# Altium footprint library GyokuRe.PcbLib: 1248 footprints (part 21 of 78)
Each footprint in its own frame and in the unit in brackets; x right, y up, seen from the top. Pads: shape width x height; smd on the part's side, far side on the other; paste and mask are expansions set on the pad; w line width, h text height; cw(c..) or ccw(c..) is an arc to the next point about the centre after c.
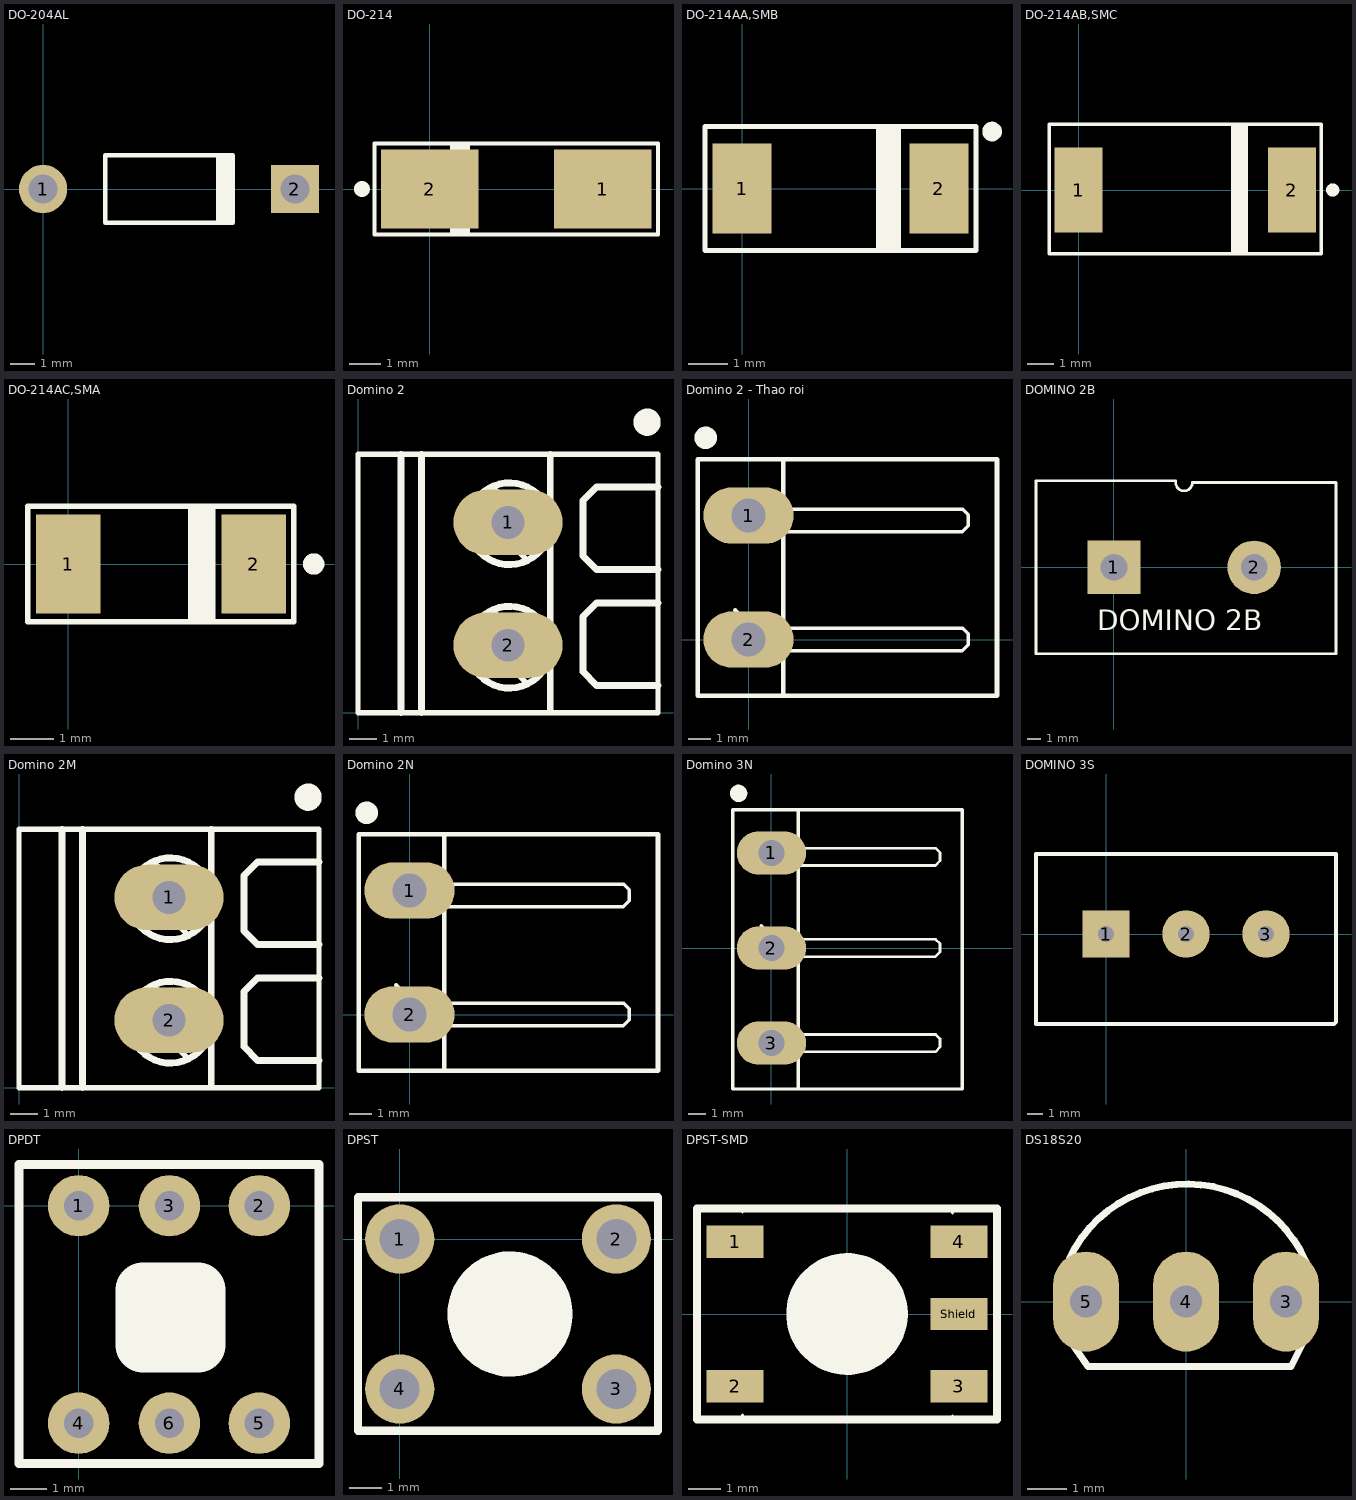
[diagram p20: the footprints below, top view; thin cyan lines are the x and y axes]

## DO-204AL [mm] "Diode, Axial; Body 5.2 x 2.7 mm (LxDia. max), Lead Dia. 0.86 mm (max)"
height 2.7
pads (2):
  round 2 hole 1.2: 1(0,0)
  rect 2x2 hole 1.2: 2(10.46,0)
Top Overlay:
  rectangle: 7.18,-1.4 7.98,1.4
  lines w0.2: 7.88,-1.4 2.58,-1.4 2.58,1.4 7.88,1.4

## DO-214 [mm]
pads (2):
  rect 3.1x2.5 smd: 1(5.5,0) 2(0,0)
Top Overlay:
  circle w0.25: c-2.157,0 r0.125
  rectangle: 0.635,-1.45 1.27,1.45
  lines w0.127: -1.75,-1.45 7.25,-1.45 7.25,1.45 -1.75,1.45 -1.75,-1.45

## DO-214AA,SMB [mm]
pads (2):
  rect 1.5x2.3 smd: 1(0,0) 2(5,0)
Top Overlay:
  circle w0.25: c6.352,1.448 r0.125
  rectangle: 3.404,-1.6 4.039,1.575
  lines w0.127: -0.95,-1.575 5.944,-1.575 5.944,1.575 -0.95,1.575 -0.95,-1.575
3D body "DO-214AA SMB.STEP": height 2.3, standoff 0, extent -0.185,-1.778 5.215,1.822

## DO-214AB,SMC [mm]
height 0.508
pads (2):
  rect 1.8x3.2 smd: 1(0,0) 2(8,0)
Top Overlay:
  circle w0.25: c9.527,0 r0.125
  rectangle: 5.715,-2.388 6.35,2.464
  lines w0.127: -1.1,-2.388 9.1,-2.388 9.1,2.464 -1.1,2.464 -1.1,-2.388
3D body "DO-214AB SMC.STEP": height 2.3, standoff 0, extent 0.038,-2.972 7.988,2.928

## DO-214AC,SMA [mil]
pads (2):
  rect 59.06x90.55 smd: 1(0,0) 2(170,0)
Top Overlay:
  circle w9.84: c225.08,0 r4.92
  rectangle: 110,-53.15 135,53.15
  lines w5: -37.4,-53.15 206.69,-53.15 206.69,53.15 -37.4,53.15 -37.4,-53.15
3D body "DO-214AC SMA.STEP": height 94.69, standoff 0, extent -17.36,-51 187.36,51.36

## Domino 2 [mm]
pads (2):
  oval 4x2.4 hole 1.2: 1(5.5,6.975) 2(5.5,2.475)
Top Overlay:
  circle w0.5: c10.6,10.65 r0.25
  circle w0.254: c5.55,2.4 r1.5
  circle w0.254: c5.55,6.925 r1.5
  lines w0.2: 4.2,3.075 6.2,1.075 ; 4.2,7.6 6.2,5.6 ; 4.912,3.762 6.913,1.762 ; 4.912,8.287 6.913,6.287 ; 0,0 0,9.475 11,9.475 11,0 0,0
  lines w0.254: 1.575,0 1.575,9.475 ; 2.325,0 2.325,9.475 ; 7.05,0.025 7.05,9.475 ; 11,1 8.75,1 8.25,1.5 8.25,3.525 8.75,4.025 11,4.025 ; 11,5.25 8.75,5.25 8.25,5.75 8.25,7.775 8.75,8.275 11,8.275
3D body: height 4.5, standoff 0.01, extent 0,0 11,9.475
3D body: height 8.5, standoff 4.5, extent 2.8,0.975 7.5,8.475
3D body: height 2.5, standoff -1, extent 4.975,6.425 6.075,7.525
3D body: height 2.5, standoff -1, extent 4.975,1.9 6.075,3
3D body: height 3.5, standoff 1, extent 9.266,6.191 10.25,7.701
3D body: height 3.5, standoff 1, extent 9.266,1.841 10.25,3.351
3D body: height 8.55, standoff 7.6, extent 4.4,5.95 6.65,8
3D body: height 8.6, standoff 7.6, extent 4.504,6.05 5.404,7.9
3D body: height 8.6, standoff 7.6, extent 5.654,6.058 6.554,7.908
3D body: height 8.6, standoff 7.6, extent 5.654,1.533 6.554,3.383
3D body: height 8.6, standoff 7.6, extent 4.504,1.525 5.404,3.375
3D body: height 8.55, standoff 7.6, extent 4.4,1.425 6.65,3.475

## Domino 2 - Thao roi [mm]
pads (2):
  oval 4x2.5 hole 1.5: 1(0,5.5) 2(0,0)
Top Overlay:
  circle w0.5: c-1.9,8.95 r0.25
  lines w0.15: 1.55,-0.6 1.65,-0.5 9.475,-0.5 9.75,-0.225 9.75,0.25 9.5,0.5 1.55,0.5 ; 1.55,4.675 1.65,4.775 9.475,4.775 9.75,5.05 9.75,5.525 9.5,5.775 1.55,5.775
  lines w0.2: -0.587,1.287 1.413,-0.713 ; 1.55,-2.5 1.55,7.925 ; -2.25,-2.5 -2.25,8 11.025,8 11.025,-2.5 -2.25,-2.5
Bottom Overlay:
  lines w0.1: -2.286,-2.489 -2.286,7.976 11.024,7.976 11.024,-2.489 -2.286,-2.489
3D body: height 9, standoff 7.9, extent 8.458,-2.489 11.074,8.001
3D body: height 5.5, standoff 4.5, extent 0,5.001 10,5.999
3D body: height 5.5, standoff 4.5, extent 0,-0.499 10,0.499
3D body: height 8, standoff 1, extent -1.092,-2.54 0.254,7.925
3D body: height 1, standoff 0.1, extent -1.092,-2.489 11.074,7.976
3D body: height 8, standoff 7, extent -1.092,-2.489 11.074,7.976

## DOMINO 2B [mm]
pads (2):
  rect 4x4 hole 2: 1(0,0)
  round 4 hole 2: 2(10.5,0)
Top Overlay:
  lines w0.2: 4.625,6.35 ccw(c5.25,6.35) 5.875,6.35 16.637,6.35 16.637,-6.477 -5.842,-6.477 -5.842,6.477 4.625,6.477
  text "DOMINO 2B" at -1.27,-4.699 h1.52

## Domino 2M [mm]
pads (2):
  oval 4x2.4 hole 1.2: 1(5.5,6.975) 2(5.5,2.475)
Top Overlay:
  circle w0.254: c5.55,6.925 r1.5
  circle w0.254: c5.55,2.4 r1.5
  circle w0.5: c10.6,10.65 r0.25
  lines w0.2: 4.2,3.075 6.2,1.075 ; 4.2,7.6 6.2,5.6 ; 4.912,3.762 6.913,1.762 ; 4.912,8.287 6.913,6.287 ; 0,0 11,0 11,9.475 0,9.475 0,0
  lines w0.254: 1.575,0 1.575,9.475 ; 2.325,0 2.325,9.475 ; 7.05,0.025 7.05,9.475 ; 11,1 8.75,1 8.25,1.5 8.25,3.525 8.75,4.025 11,4.025 ; 11,5.25 8.75,5.25 8.25,5.75 8.25,7.775 8.75,8.275 11,8.275
3D body "KRM2 domino 2 nho.STEP": height 10, standoff -4, extent 1.346,-0.225 8.846,9.775
3D body: height 8.6, standoff 7.6, extent 4.504,1.525 5.404,3.375
3D body: height 8.6, standoff 7.6, extent 5.654,1.533 6.554,3.383
3D body: height 8.6, standoff 7.6, extent 5.654,6.058 6.554,7.908
3D body: height 8.6, standoff 7.6, extent 4.504,6.05 5.404,7.9

## Domino 2N [mm]
pads (2):
  oval 4x2.5 hole 1.5: 1(0,5.5) 2(0,0)
Top Overlay:
  circle w0.5: c-1.9,8.95 r0.25
  lines w0.15: 1.55,-0.6 1.65,-0.5 9.475,-0.5 9.75,-0.225 9.75,0.25 9.5,0.5 1.55,0.5 ; 1.55,4.675 1.65,4.775 9.475,4.775 9.75,5.05 9.75,5.525 9.5,5.775 1.55,5.775
  lines w0.2: -0.587,1.287 1.413,-0.713 ; 1.55,-2.5 1.55,7.925 ; -2.25,-2.5 -2.25,8 11.025,8 11.025,-2.5 -2.25,-2.5
Bottom Overlay:
  lines w0.1: -2.286,-2.489 -2.286,7.976 11.024,7.976 11.024,-2.489 -2.286,-2.489
3D body "Domino2N.STEP": height 8.47, standoff -4, extent -1.758,-2.21 10.242,7.79

## Domino 3N [mm]
pads (3):
  oval 4x2.5 hole 1.5: 1(0,5.5) 2(0,0) 3(0,-5.5)
Top Overlay:
  circle w0.5: c-1.9,8.95 r0.25
  lines w0.15: 1.55,-6.1 1.65,-6 9.475,-6 9.75,-5.725 9.75,-5.25 9.5,-5 1.55,-5 ; 1.55,-0.6 1.65,-0.5 9.475,-0.5 9.75,-0.225 9.75,0.25 9.5,0.5 1.55,0.5 ; 1.55,4.675 1.65,4.775 9.475,4.775 9.75,5.05 9.75,5.525 9.5,5.775 1.55,5.775
  lines w0.2: -0.587,1.287 1.413,-0.713 ; 1.55,-8.153 1.55,7.925 ; -2.25,-8.153 11.025,-8.153 11.025,8 -2.25,8 -2.25,-8.153
Bottom Overlay:
  lines w0.1: -2.286,-8.153 11.024,-8.153 11.024,7.976 -2.286,7.976 -2.286,-8.153

## DOMINO 3S [mm] "3 terminal 5.04 spacing"
pads (3):
  rect 3x3 hole 1: 1(0,0)
  round 3 hole 1: 2(5.08,0) 3(10.16,0)
Top Overlay:
  lines w0.254: -4.445,-5.715 14.478,-5.715 14.605,-5.588 14.605,5.08 -4.445,5.08 -4.445,-5.715

## DPDT [mil] "Double-Pole, Double-Throw Switch; 6 Leads; Solder Pad 35mil"
pads (6):
  round 67 hole 32: 1(0,0) 2(197,0) 3(99,0) 4(0,-237) 5(197,-237) 6(99,-237)
Top Overlay:
  lines w10: -65,-281 -65,45 262,45 262,-281 -65,-281
  lines w60: 70,-152 70,-92 130,-92 130,-152 70,-152
3D body "User Library-PSM1-0-0.STEP": height 531.5, standoff -137.8, extent -58.96,-275.48 256,39.48

## DPST [mil] "Double-Pole, Single-Throw Switch; 4 Leads; Solder Pad 35mil"
pads (4):
  round 83 hole 48: 1(0,0) 2(260,0) 3(260,-180) 4(0,-180)
Top Overlay:
  circle w80: c132.5,-90 r35
  lines w10: -50,-230 310,-230 310,50 -50,50 -50,-230
3D body "SW3dPS-diptronics tactile dts-63k.STEP": height 275.59, standoff -137.8, extent -25.51,-212.04 285.52,32.06

## DPST-SMD [mil] "Double-Pole, Single-Throw Switch; 4 Leads; Solder Pad 35mil"
pads (5):
  rect 70x40 smd: 1(-138,89) 2(-138,-89) 3(138,-89) 4(138,89) Shield(138,0)
Top Overlay:
  circle w80: c0,0 r35
  lines w4: -129,-130 -129,-125 ; -129,126 -129,130 ; 130,-130 130,-126 ; 130,125 130,130
  lines w10: -185,-130 185,-130 185,130 -185,130 -185,-130
3D body: height 122.05, standoff 78.74, extent -59.04,-59.04 59.04,59.04
3D body: height 82.68, standoff 39.37, extent -135,-42 -122,41
3D body: height 23.62, standoff 15.75, extent -137,-104 -122,-73
3D body: height 23.62, standoff 0, extent -145,-104 -137,-73
3D body: height 7.87, standoff 0, extent -167,-104 -145,-73
3D body: height 23.62, standoff 15.75, extent -137,73 -122,104
3D body: height 23.62, standoff 0, extent -145,73 -137,104
3D body: height 7.87, standoff 0, extent -167,73 -145,104
3D body: height 23.62, standoff 15.75, extent 122,73 137,104
3D body: height 23.62, standoff 0, extent 137,73 145,104
3D body: height 7.87, standoff 0, extent 145,73 167,104
3D body: height 7.87, standoff 0, extent 145,-104 167,-73
3D body: height 23.62, standoff 0, extent 137,-104 145,-73
3D body: height 23.62, standoff 15.75, extent 122,-104 137,-73
3D body: height 7.87, standoff 0, extent 135,13 137,23
3D body: height 7.87, standoff 0, extent 135,-23 137,-11
3D body: height 7.87, standoff 0, extent 135,-11 167,13
3D body: height 82.68, standoff 0, extent 122,-41 135,42
3D body: height 82.68, standoff 78.74, extent -130,-130 130,130
3D body: height 78.74, standoff 3.94, extent -129.98,-129.98 129.98,129.98

## DS18S20 [mil] "TO-92"
height 200
pads (3):
  oval 66x100 hole 32: 3(100,0) 4(0,0) 5(-100,0)
Top Overlay:
  lines w7: -116.52,43.21 cw(c0.97,-12.43) 119.94,39.97 ; -115.34,-40.24 -98,-65 105,-65 118,-39